# Altium integrated library LEMO Unipole And Multipole Type Connectors.IntLib: 1566 symbols (part 9 of 13)
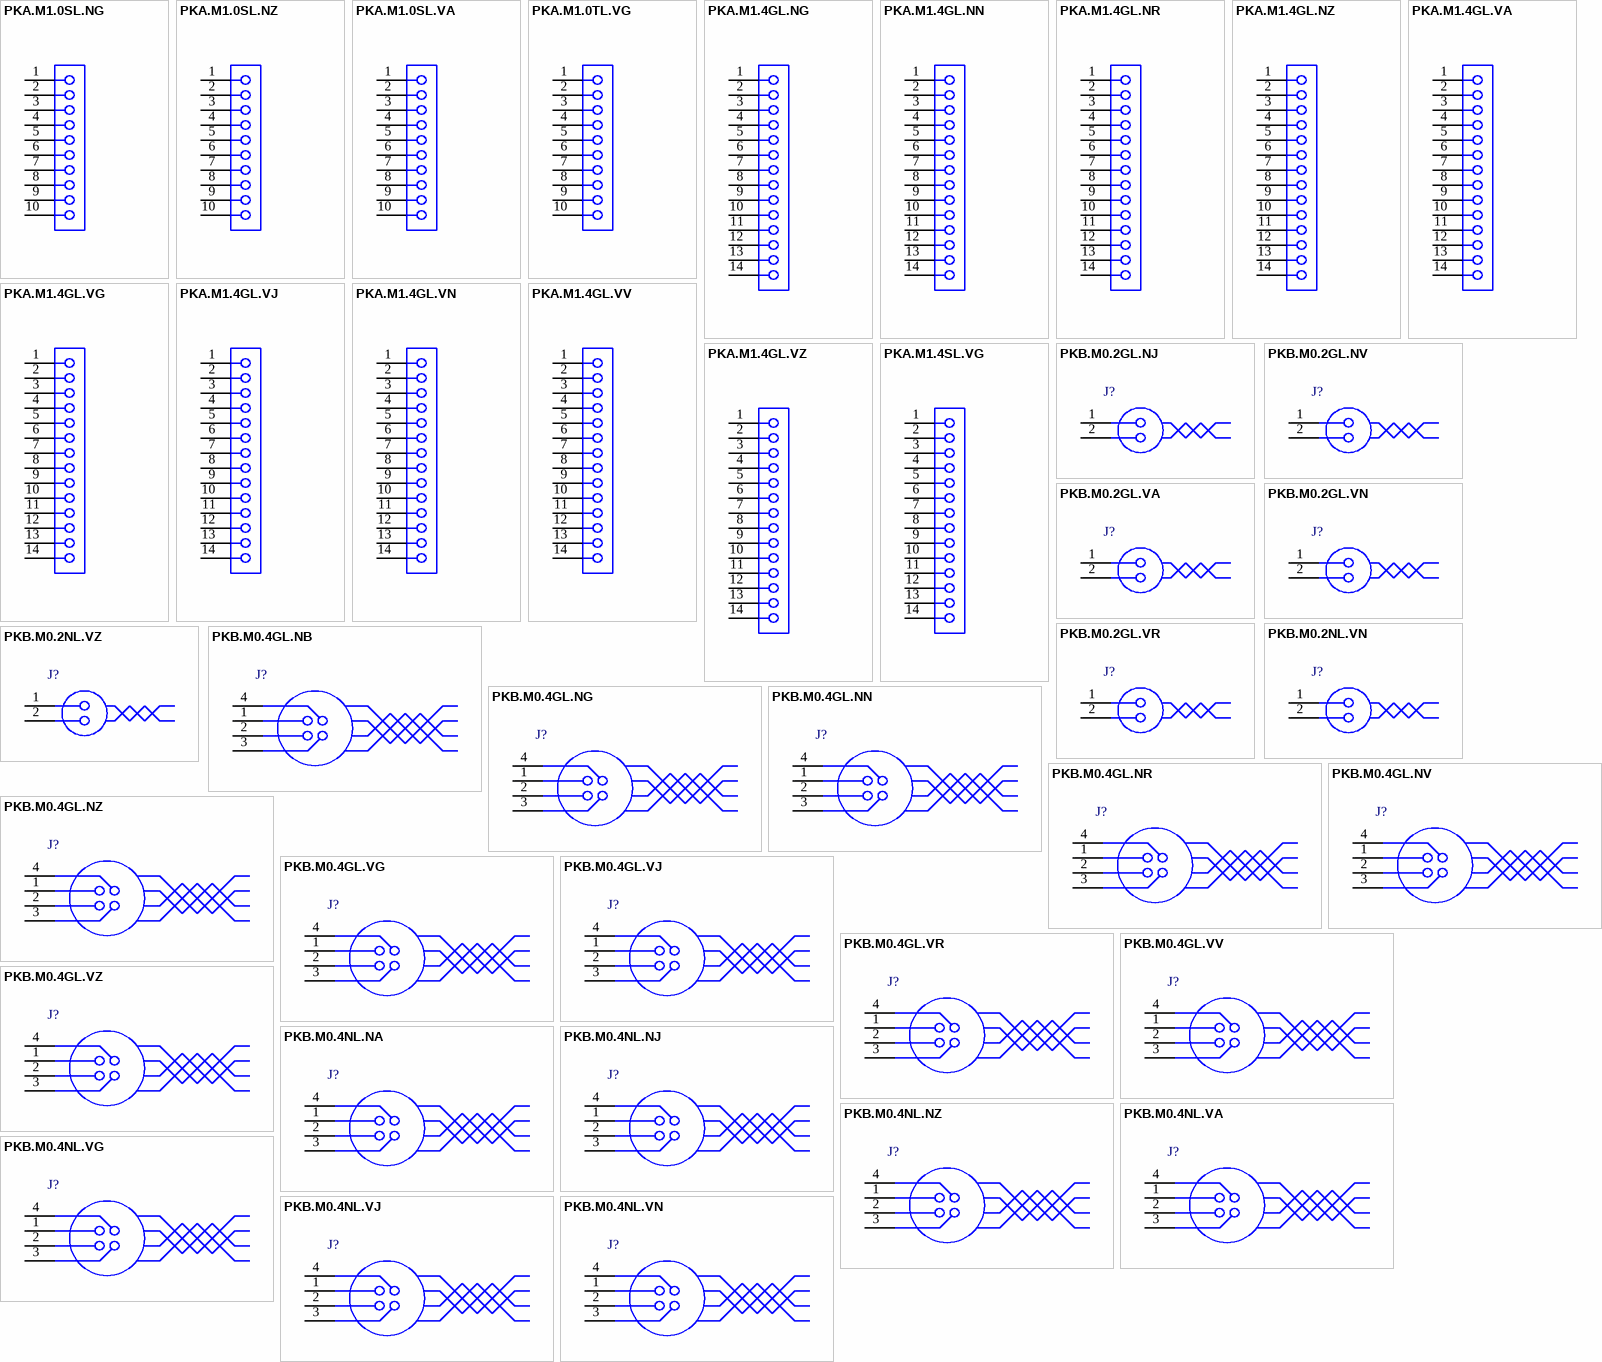
[diagram p51: symbols PKA.M1.0SL.NG to PKB.M0.4NL.VN]

## PKB.M0.4GL.NZ
designator J?
Fixed receptacle with 1 nut (without 2nd front nut), Key (B), P series, Multipole Type with 4 Contacts; Manufacturer: LEMO; PartNumber: PKB.M0.4GL.NZ; Number of contacts: 4; Contact Diameter: 0.9 mm; Test voltage (kV rms) Contact-Contact: 1.2; Rated Current(A): 8; DatasheetVersion: Jun-14; PackageReference: PKB.M0.4GL.NZ; PackageDescription: Fixed receptacle with 1 nut (without 2nd front nut), Key(B) for Printed Circuit; ComponentLink1Description: Manufacturer URL; ComponentLink1URL: http://www.lemo.com; ComponentLink2Description: Datasheet; ComponentLink2URL: http://intra.lemo.ch/catalog/ROW/UK_English/P_series_catalog.pdf
footprint PKB.M0.4GL.NZ (Socket, Female, Height 25 mm, Through hole)
pins: 1, 2, 3, 4

## PKB.M0.4GL.VG
designator J?
Fixed receptacle with two nuts (back panel mounting), 90° print contacts, Key (B), P series, Multipole Type with 4 Contacts; Manufacturer: LEMO; PartNumber: PKB.M0.4GL.VG; Number of contacts: 4; Contact Diameter: 0.9 mm; Test voltage (kV rms) Contact-Contact: 1.2; Rated Current(A): 8; DatasheetVersion: Jun-14; PackageReference: PKB.M0.4GL.VG; PackageDescription: Fixed receptacle with two nuts (back panel mounting), 90° print contacts, Key(B) for Printed Circuit; ComponentLink1Description: Manufacturer URL; ComponentLink1URL: http://www.lemo.com; ComponentLink2Description: Datasheet; ComponentLink2URL: http://intra.lemo.ch/catalog/ROW/UK_English/P_series_catalog.pdf
footprint PKB.M0.4GL.VG (Socket, Female, Height 33.5 mm, Through hole)
pins: 1, 2, 3, 4

## PKB.M0.4GL.VJ
designator J?
Fixed receptacle with two nuts (back panel mounting), 90° print contacts, Key (B), P series, Multipole Type with 4 Contacts; Manufacturer: LEMO; PartNumber: PKB.M0.4GL.VJ; Number of contacts: 4; Contact Diameter: 0.9 mm; Test voltage (kV rms) Contact-Contact: 1.2; Rated Current(A): 8; DatasheetVersion: Jun-14; PackageReference: PKB.M0.4GL.VJ; PackageDescription: Fixed receptacle with two nuts (back panel mounting), 90° print contacts, Key(B) for Printed Circuit; ComponentLink1Description: Manufacturer URL; ComponentLink1URL: http://www.lemo.com; ComponentLink2Description: Datasheet; ComponentLink2URL: http://intra.lemo.ch/catalog/ROW/UK_English/P_series_catalog.pdf
footprint PKB.M0.4GL.VJ (Socket, Female, Height 33.5 mm, Through hole)
pins: 1, 2, 3, 4

## PKB.M0.4GL.VR
designator J?
Fixed receptacle with two nuts (back panel mounting), 90° print contacts, Key (B), P series, Multipole Type with 4 Contacts; Manufacturer: LEMO; PartNumber: PKB.M0.4GL.VR; Number of contacts: 4; Contact Diameter: 0.9 mm; Test voltage (kV rms) Contact-Contact: 1.2; Rated Current(A): 8; DatasheetVersion: Jun-14; PackageReference: PKB.M0.4GL.VR; PackageDescription: Fixed receptacle with two nuts (back panel mounting), 90° print contacts, Key(B) for Printed Circuit; ComponentLink1Description: Manufacturer URL; ComponentLink1URL: http://www.lemo.com; ComponentLink2Description: Datasheet; ComponentLink2URL: http://intra.lemo.ch/catalog/ROW/UK_English/P_series_catalog.pdf
footprint PKB.M0.4GL.VR (Socket, Female, Height 33.5 mm, Through hole)
pins: 1, 2, 3, 4

## PKB.M0.4GL.VV
designator J?
Fixed receptacle with two nuts (back panel mounting), 90° print contacts, Key (B), P series, Multipole Type with 4 Contacts; Manufacturer: LEMO; PartNumber: PKB.M0.4GL.VV; Number of contacts: 4; Contact Diameter: 0.9 mm; Test voltage (kV rms) Contact-Contact: 1.2; Rated Current(A): 8; DatasheetVersion: Jun-14; PackageReference: PKB.M0.4GL.VV; PackageDescription: Fixed receptacle with two nuts (back panel mounting), 90° print contacts, Key(B) for Printed Circuit; ComponentLink1Description: Manufacturer URL; ComponentLink1URL: http://www.lemo.com; ComponentLink2Description: Datasheet; ComponentLink2URL: http://intra.lemo.ch/catalog/ROW/UK_English/P_series_catalog.pdf
footprint PKB.M0.4GL.VV (Socket, Female, Height 33.5 mm, Through hole)
pins: 1, 2, 3, 4

## PKB.M0.4GL.VZ
designator J?
Fixed receptacle with 1 nut (without 2nd front nut), Key (B), P series, Multipole Type with 4 Contacts; Manufacturer: LEMO; PartNumber: PKB.M0.4GL.VZ; Number of contacts: 4; Contact Diameter: 0.9 mm; Test voltage (kV rms) Contact-Contact: 1.2; Rated Current(A): 8; DatasheetVersion: Jun-14; PackageReference: PKB.M0.4GL.VZ; PackageDescription: Fixed receptacle with 1 nut (without 2nd front nut), Key(B) for Printed Circuit; ComponentLink1Description: Manufacturer URL; ComponentLink1URL: http://www.lemo.com; ComponentLink2Description: Datasheet; ComponentLink2URL: http://intra.lemo.ch/catalog/ROW/UK_English/P_series_catalog.pdf
footprint PKB.M0.4GL.VZ (Socket, Female, Height 33.5 mm, Through hole)
pins: 1, 2, 3, 4

## PKB.M0.4NL.NA
designator J?
Fixed receptacle with two nuts (back panel mounting), straight print contacts, Key (B),  series, Multipole Type with 4 Contacts; Manufacturer: LEMO; PartNumber: PKB.M0.4NL.NA; Number of contacts: 4; Contact Diameter: 0.9 mm; Test voltage (kV rms) Contact-Contact: 1.2; Rated Current(A): 8; DatasheetVersion: Jun-14; PackageReference: PKB.M0.4NL.NA; PackageDescription: Fixed receptacle with two nuts (back panel mounting), straight print contacts, Key(B) for Printed Circuit; ComponentLink1Description: Manufacturer URL; ComponentLink1URL: http://www.lemo.com; ComponentLink2Description: Datasheet; ComponentLink2URL: http://intra.lemo.ch/catalog/ROW/UK_English/P_series_catalog.pdf
footprint PKB.M0.4NL.NA (Socket, Female, Height 33.5 mm, Through hole)
pins: 1, 2, 3, 4

## PKB.M0.4NL.NJ
designator J?
Fixed receptacle with two nuts (back panel mounting), straight print contacts, Key (B), P series, Multipole Type with 4 Contacts; Manufacturer: LEMO; PartNumber: PKB.M0.4NL.NJ; Number of contacts: 4; Contact Diameter: 0.9 mm; Test voltage (kV rms) Contact-Contact: 1.2; Rated Current(A): 8; DatasheetVersion: Jun-14; PackageReference: PKB.M0.4NL.NJ; PackageDescription: Fixed receptacle with two nuts (back panel mounting), straight print contacts, Key(B) for Printed Circuit; ComponentLink1Description: Manufacturer URL; ComponentLink1URL: http://www.lemo.com; ComponentLink2Description: Datasheet; ComponentLink2URL: http://intra.lemo.ch/catalog/ROW/UK_English/P_series_catalog.pdf
footprint PKB.M0.4NL.NJ (Socket, Female, Height 33.5 mm, Through hole)
pins: 1, 2, 3, 4

## PKB.M0.4NL.NZ
designator J?
Fixed receptacle with 1 nut (without 2nd front nut), Key (B), P series, Multipole Type with 4 Contacts; Manufacturer: LEMO; PartNumber: PKB.M0.4NL.NZ; Number of contacts: 4; Contact Diameter: 0.9 mm; Test voltage (kV rms) Contact-Contact: 1.2; Rated Current(A): 8; DatasheetVersion: Jun-14; PackageReference: PKB.M0.4NL.NZ; PackageDescription: Fixed receptacle with 1 nut (without 2nd front nut), Key(B) for Printed Circuit; ComponentLink1Description: Manufacturer URL; ComponentLink1URL: http://www.lemo.com; ComponentLink2Description: Datasheet; ComponentLink2URL: http://intra.lemo.ch/catalog/ROW/UK_English/P_series_catalog.pdf
footprint PKB.M0.4NL.NZ (Socket, Female, Height 25 mm, Through hole)
pins: 1, 2, 3, 4

## PKB.M0.4NL.VA
designator J?
Fixed receptacle with two nuts (back panel mounting), 90° print contacts, Key (B),  series, Multipole Type with 4 Contacts; Manufacturer: LEMO; PartNumber: PKB.M0.4NL.VA; Number of contacts: 4; Contact Diameter: 0.9 mm; Test voltage (kV rms) Contact-Contact: 1.2; Rated Current(A): 8; DatasheetVersion: Jun-14; PackageReference: PKB.M0.4NL.VA; PackageDescription: Fixed receptacle with two nuts (back panel mounting), 90° print contacts, Key(B) for Printed Circuit; ComponentLink1Description: Manufacturer URL; ComponentLink1URL: http://www.lemo.com; ComponentLink2Description: Datasheet; ComponentLink2URL: http://intra.lemo.ch/catalog/ROW/UK_English/P_series_catalog.pdf
footprint PKB.M0.4NL.VA (Socket, Female, Height 33.5 mm, Through hole)
pins: 1, 2, 3, 4

## PKB.M0.4NL.VG
designator J?
Fixed receptacle with two nuts (back panel mounting), 90° print contacts, Key (B), P series, Multipole Type with 4 Contacts; Manufacturer: LEMO; PartNumber: PKB.M0.4NL.VG; Number of contacts: 4; Contact Diameter: 0.9 mm; Test voltage (kV rms) Contact-Contact: 1.2; Rated Current(A): 8; DatasheetVersion: Jun-14; PackageReference: PKB.M0.4NL.VG; PackageDescription: Fixed receptacle with two nuts (back panel mounting), 90° print contacts, Key(B) for Printed Circuit; ComponentLink1Description: Manufacturer URL; ComponentLink1URL: http://www.lemo.com; ComponentLink2Description: Datasheet; ComponentLink2URL: http://intra.lemo.ch/catalog/ROW/UK_English/P_series_catalog.pdf
footprint PKB.M0.4NL.VG (Socket, Female, Height 33.5 mm, Through hole)
pins: 1, 2, 3, 4

## PKB.M0.4NL.VJ
designator J?
Fixed receptacle with two nuts (back panel mounting), 90° print contacts, Key (B), P series, Multipole Type with 4 Contacts; Manufacturer: LEMO; PartNumber: PKB.M0.4NL.VJ; Number of contacts: 4; Contact Diameter: 0.9 mm; Test voltage (kV rms) Contact-Contact: 1.2; Rated Current(A): 8; DatasheetVersion: Jun-14; PackageReference: PKB.M0.4NL.VJ; PackageDescription: Fixed receptacle with two nuts (back panel mounting), 90° print contacts, Key(B) for Printed Circuit; ComponentLink1Description: Manufacturer URL; ComponentLink1URL: http://www.lemo.com; ComponentLink2Description: Datasheet; ComponentLink2URL: http://intra.lemo.ch/catalog/ROW/UK_English/P_series_catalog.pdf
footprint PKB.M0.4NL.VJ (Socket, Female, Height 33.5 mm, Through hole)
pins: 1, 2, 3, 4

## PKB.M0.4NL.VN
designator J?
Fixed receptacle with two nuts (back panel mounting), 90° print contacts, Key (B), P series, Multipole Type with 4 Contacts; Manufacturer: LEMO; PartNumber: PKB.M0.4NL.VN; Number of contacts: 4; Contact Diameter: 0.9 mm; Test voltage (kV rms) Contact-Contact: 1.2; Rated Current(A): 8; DatasheetVersion: Jun-14; PackageReference: PKB.M0.4NL.VN; PackageDescription: Fixed receptacle with two nuts (back panel mounting), 90° print contacts, Key(B) for Printed Circuit; ComponentLink1Description: Manufacturer URL; ComponentLink1URL: http://www.lemo.com; ComponentLink2Description: Datasheet; ComponentLink2URL: http://intra.lemo.ch/catalog/ROW/UK_English/P_series_catalog.pdf
footprint PKB.M0.4NL.VN (Socket, Female, Height 33.5 mm, Through hole)
pins: 1, 2, 3, 4

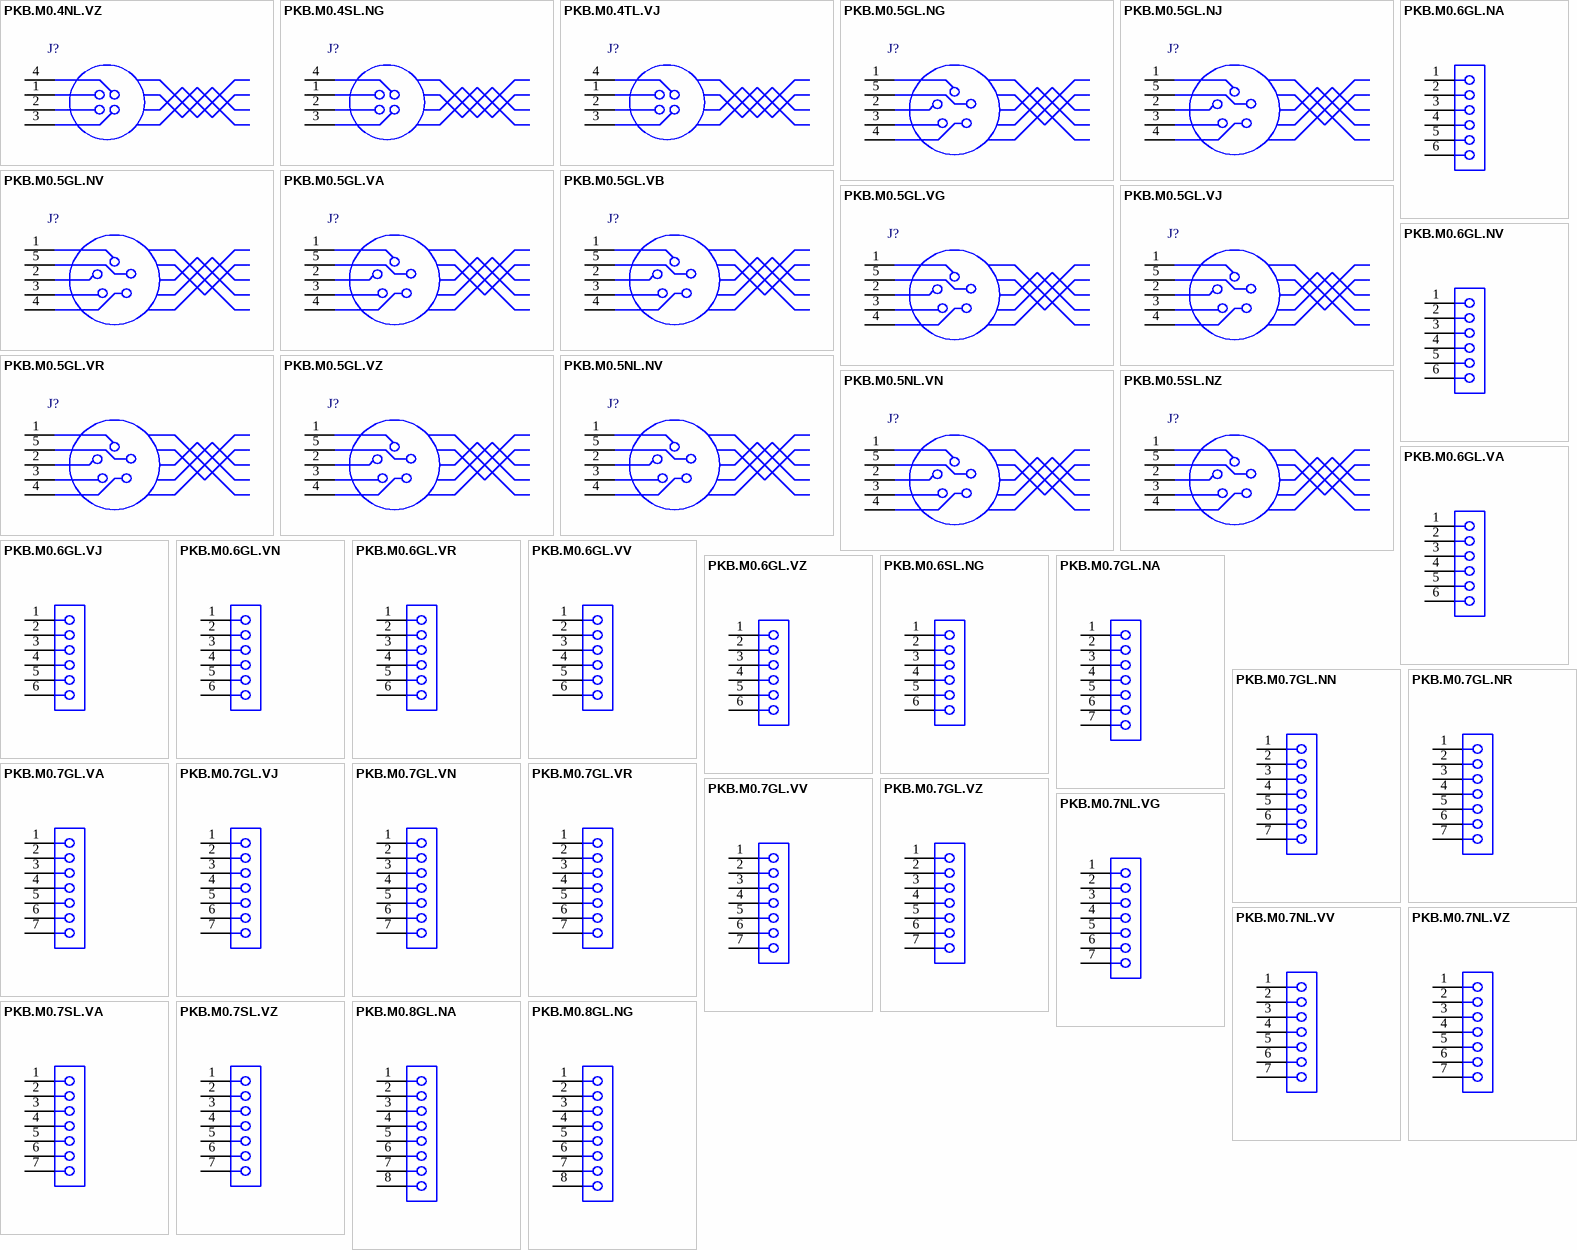
[diagram p28: symbols PKB.M0.4NL.VZ to PKB.M0.8GL.NG]

## PKB.M0.4NL.VZ
designator J?
Fixed receptacle with 1 nut (without 2nd front nut), Key (B), P series, Multipole Type with 4 Contacts; Manufacturer: LEMO; PartNumber: PKB.M0.4NL.VZ; Number of contacts: 4; Contact Diameter: 0.9 mm; Test voltage (kV rms) Contact-Contact: 1.2; Rated Current(A): 8; DatasheetVersion: Jun-14; PackageReference: PKB.M0.4NL.VZ; PackageDescription: Fixed receptacle with 1 nut (without 2nd front nut), Key(B) for Printed Circuit; ComponentLink1Description: Manufacturer URL; ComponentLink1URL: http://www.lemo.com; ComponentLink2Description: Datasheet; ComponentLink2URL: http://intra.lemo.ch/catalog/ROW/UK_English/P_series_catalog.pdf
footprint PKB.M0.4NL.VZ (Socket, Female, Height 33.5 mm, Through hole)
pins: 1, 2, 3, 4

## PKB.M0.4SL.NG
designator J?
Fixed receptacle with two nuts (back panel mounting), straight print contacts, Key (B), P series, Multipole Type with 4 Contacts; Manufacturer: LEMO; PartNumber: PKB.M0.4SL.NG; Number of contacts: 4; Contact Diameter: 0.9 mm; Test voltage (kV rms) Contact-Contact: 1.2; Rated Current(A): 8; DatasheetVersion: Jun-14; PackageReference: PKB.M0.4SL.NG; PackageDescription: Fixed receptacle with two nuts (back panel mounting), straight print contacts, Key(B) for Printed Circuit; ComponentLink1Description: Manufacturer URL; ComponentLink1URL: http://www.lemo.com; ComponentLink2Description: Datasheet; ComponentLink2URL: http://intra.lemo.ch/catalog/ROW/UK_English/P_series_catalog.pdf
footprint PKB.M0.4SL.NG (Socket, Female, Height 33.5 mm, Through hole)
pins: 1, 2, 3, 4

## PKB.M0.4TL.VJ
designator J?
Fixed receptacle with two nuts (back panel mounting), 90° print contacts, Key (B), P series, Multipole Type with 4 Contacts; Manufacturer: LEMO; PartNumber: PKB.M0.4TL.VJ; Number of contacts: 4; Contact Diameter: 0.9 mm; Test voltage (kV rms) Contact-Contact: 1.2; Rated Current(A): 8; DatasheetVersion: Jun-14; PackageReference: PKB.M0.4TL.VJ; PackageDescription: Fixed receptacle with two nuts (back panel mounting), 90° print contacts, Key(B) for Printed Circuit; ComponentLink1Description: Manufacturer URL; ComponentLink1URL: http://www.lemo.com; ComponentLink2Description: Datasheet; ComponentLink2URL: http://intra.lemo.ch/catalog/ROW/UK_English/P_series_catalog.pdf
footprint PKB.M0.4TL.VJ (Socket, Female, Height 33.5 mm, Through hole)
pins: 1, 2, 3, 4

## PKB.M0.5GL.NG
designator J?
Fixed receptacle with two nuts (back panel mounting), straight print contacts, Key (B), P series, Multipole Type with 5 Contacts; Manufacturer: LEMO; PartNumber: PKB.M0.5GL.NG; Number of contacts: 5; Contact Diameter: 0.9 mm; Test voltage (kV rms) Contact-Contact: 1.05; Rated Current(A): 7; DatasheetVersion: Jun-14; PackageReference: PKB.M0.5GL.NG; PackageDescription: Fixed receptacle with two nuts (back panel mounting), straight print contacts, Key(B) for Printed Circuit; ComponentLink1Description: Manufacturer URL; ComponentLink1URL: http://www.lemo.com; ComponentLink2Description: Datasheet; ComponentLink2URL: http://intra.lemo.ch/catalog/ROW/UK_English/P_series_catalog.pdf
footprint PKB.M0.5GL.NG (Socket, Female, Height 33.5 mm, Through hole)
pins: 1, 2, 3, 4, 5

## PKB.M0.5GL.NJ
designator J?
Fixed receptacle with two nuts (back panel mounting), straight print contacts, Key (B), P series, Multipole Type with 5 Contacts; Manufacturer: LEMO; PartNumber: PKB.M0.5GL.NJ; Number of contacts: 5; Contact Diameter: 0.9 mm; Test voltage (kV rms) Contact-Contact: 1.05; Rated Current(A): 7; DatasheetVersion: Jun-14; PackageReference: PKB.M0.5GL.NJ; PackageDescription: Fixed receptacle with two nuts (back panel mounting), straight print contacts, Key(B) for Printed Circuit; ComponentLink1Description: Manufacturer URL; ComponentLink1URL: http://www.lemo.com; ComponentLink2Description: Datasheet; ComponentLink2URL: http://intra.lemo.ch/catalog/ROW/UK_English/P_series_catalog.pdf
footprint PKB.M0.5GL.NJ (Socket, Female, Height 33.5 mm, Through hole)
pins: 1, 2, 3, 4, 5

## PKB.M0.5GL.NV
designator J?
Fixed receptacle with two nuts (back panel mounting), straight print contacts, Key (B), P series, Multipole Type with 5 Contacts; Manufacturer: LEMO; PartNumber: PKB.M0.5GL.NV; Number of contacts: 5; Contact Diameter: 0.9 mm; Test voltage (kV rms) Contact-Contact: 1.05; Rated Current(A): 7; DatasheetVersion: Jun-14; PackageReference: PKB.M0.5GL.NV; PackageDescription: Fixed receptacle with two nuts (back panel mounting), straight print contacts, Key(B) for Printed Circuit; ComponentLink1Description: Manufacturer URL; ComponentLink1URL: http://www.lemo.com; ComponentLink2Description: Datasheet; ComponentLink2URL: http://intra.lemo.ch/catalog/ROW/UK_English/P_series_catalog.pdf
footprint PKB.M0.5GL.NV (Socket, Female, Height 33.5 mm, Through hole)
pins: 1, 2, 3, 4, 5

## PKB.M0.5GL.VA
designator J?
Fixed receptacle with two nuts (back panel mounting), 90° print contacts, Key (B),  series, Multipole Type with 5 Contacts; Manufacturer: LEMO; PartNumber: PKB.M0.5GL.VA; Number of contacts: 5; Contact Diameter: 0.9 mm; Test voltage (kV rms) Contact-Contact: 1.05; Rated Current(A): 7; DatasheetVersion: Jun-14; PackageReference: PKB.M0.5GL.VA; PackageDescription: Fixed receptacle with two nuts (back panel mounting), 90° print contacts, Key(B) for Printed Circuit; ComponentLink1Description: Manufacturer URL; ComponentLink1URL: http://www.lemo.com; ComponentLink2Description: Datasheet; ComponentLink2URL: http://intra.lemo.ch/catalog/ROW/UK_English/P_series_catalog.pdf
footprint PKB.M0.5GL.VA (Socket, Female, Height 33.5 mm, Through hole)
pins: 1, 2, 3, 4, 5

## PKB.M0.5GL.VB
designator J?
Fixed receptacle with two nuts (back panel mounting), 90° print contacts, Key (B), P series, Multipole Type with 5 Contacts; Manufacturer: LEMO; PartNumber: PKB.M0.5GL.VB; Number of contacts: 5; Contact Diameter: 0.9 mm; Test voltage (kV rms) Contact-Contact: 1.05; Rated Current(A): 7; DatasheetVersion: Jun-14; PackageReference: PKB.M0.5GL.VB; PackageDescription: Fixed receptacle with two nuts (back panel mounting), 90° print contacts, Key(B) for Printed Circuit; ComponentLink1Description: Manufacturer URL; ComponentLink1URL: http://www.lemo.com; ComponentLink2Description: Datasheet; ComponentLink2URL: http://intra.lemo.ch/catalog/ROW/UK_English/P_series_catalog.pdf
footprint PKB.M0.5GL.VB (Socket, Female, Through hole)
pins: 1, 2, 3, 4, 5

## PKB.M0.5GL.VG
designator J?
Fixed receptacle with two nuts (back panel mounting), 90° print contacts, Key (B), P series, Multipole Type with 5 Contacts; Manufacturer: LEMO; PartNumber: PKB.M0.5GL.VG; Number of contacts: 5; Contact Diameter: 0.9 mm; Test voltage (kV rms) Contact-Contact: 1.05; Rated Current(A): 7; DatasheetVersion: Jun-14; PackageReference: PKB.M0.5GL.VG; PackageDescription: Fixed receptacle with two nuts (back panel mounting), 90° print contacts, Key(B) for Printed Circuit; ComponentLink1Description: Manufacturer URL; ComponentLink1URL: http://www.lemo.com; ComponentLink2Description: Datasheet; ComponentLink2URL: http://intra.lemo.ch/catalog/ROW/UK_English/P_series_catalog.pdf
footprint PKB.M0.5GL.VG (Socket, Female, Height 33.5 mm, Through hole)
pins: 1, 2, 3, 4, 5

## PKB.M0.5GL.VJ
designator J?
Fixed receptacle with two nuts (back panel mounting), 90° print contacts, Key (B), P series, Multipole Type with 5 Contacts; Manufacturer: LEMO; PartNumber: PKB.M0.5GL.VJ; Number of contacts: 5; Contact Diameter: 0.9 mm; Test voltage (kV rms) Contact-Contact: 1.05; Rated Current(A): 7; DatasheetVersion: Jun-14; PackageReference: PKB.M0.5GL.VJ; PackageDescription: Fixed receptacle with two nuts (back panel mounting), 90° print contacts, Key(B) for Printed Circuit; ComponentLink1Description: Manufacturer URL; ComponentLink1URL: http://www.lemo.com; ComponentLink2Description: Datasheet; ComponentLink2URL: http://intra.lemo.ch/catalog/ROW/UK_English/P_series_catalog.pdf
footprint PKB.M0.5GL.VJ (Socket, Female, Height 33.5 mm, Through hole)
pins: 1, 2, 3, 4, 5

## PKB.M0.5GL.VR
designator J?
Fixed receptacle with two nuts (back panel mounting), 90° print contacts, Key (B), P series, Multipole Type with 5 Contacts; Manufacturer: LEMO; PartNumber: PKB.M0.5GL.VR; Number of contacts: 5; Contact Diameter: 0.9 mm; Test voltage (kV rms) Contact-Contact: 1.05; Rated Current(A): 7; DatasheetVersion: Jun-14; PackageReference: PKB.M0.5GL.VR; PackageDescription: Fixed receptacle with two nuts (back panel mounting), 90° print contacts, Key(B) for Printed Circuit; ComponentLink1Description: Manufacturer URL; ComponentLink1URL: http://www.lemo.com; ComponentLink2Description: Datasheet; ComponentLink2URL: http://intra.lemo.ch/catalog/ROW/UK_English/P_series_catalog.pdf
footprint PKB.M0.5GL.VR (Socket, Female, Height 33.5 mm, Through hole)
pins: 1, 2, 3, 4, 5

## PKB.M0.5GL.VZ
designator J?
Fixed receptacle with 1 nut (without 2nd front nut), Key (B), P series, Multipole Type with 5 Contacts; Manufacturer: LEMO; PartNumber: PKB.M0.5GL.VZ; Number of contacts: 5; Contact Diameter: 0.9 mm; Test voltage (kV rms) Contact-Contact: 1.05; Rated Current(A): 7; DatasheetVersion: Jun-14; PackageReference: PKB.M0.5GL.VZ; PackageDescription: Fixed receptacle with 1 nut (without 2nd front nut), Key(B) for Printed Circuit; ComponentLink1Description: Manufacturer URL; ComponentLink1URL: http://www.lemo.com; ComponentLink2Description: Datasheet; ComponentLink2URL: http://intra.lemo.ch/catalog/ROW/UK_English/P_series_catalog.pdf
footprint PKB.M0.5GL.VZ (Socket, Female, Height 33.5 mm, Through hole)
pins: 1, 2, 3, 4, 5

## PKB.M0.5NL.NV
designator J?
Fixed receptacle with two nuts (back panel mounting), straight print contacts, Key (B), P series, Multipole Type with 5 Contacts; Manufacturer: LEMO; PartNumber: PKB.M0.5NL.NV; Number of contacts: 5; Contact Diameter: 0.9 mm; Test voltage (kV rms) Contact-Contact: 1.05; Rated Current(A): 7; DatasheetVersion: Jun-14; PackageReference: PKB.M0.5NL.NV; PackageDescription: Fixed receptacle with two nuts (back panel mounting), straight print contacts, Key(B) for Printed Circuit; ComponentLink1Description: Manufacturer URL; ComponentLink1URL: http://www.lemo.com; ComponentLink2Description: Datasheet; ComponentLink2URL: http://intra.lemo.ch/catalog/ROW/UK_English/P_series_catalog.pdf
footprint PKB.M0.5NL.NV (Socket, Female, Height 33.5 mm, Through hole)
pins: 1, 2, 3, 4, 5

## PKB.M0.5NL.VN
designator J?
Fixed receptacle with two nuts (back panel mounting), 90° print contacts, Key (B), P series, Multipole Type with 5 Contacts; Manufacturer: LEMO; PartNumber: PKB.M0.5NL.VN; Number of contacts: 5; Contact Diameter: 0.9 mm; Test voltage (kV rms) Contact-Contact: 1.05; Rated Current(A): 7; DatasheetVersion: Jun-14; PackageReference: PKB.M0.5NL.VN; PackageDescription: Fixed receptacle with two nuts (back panel mounting), 90° print contacts, Key(B) for Printed Circuit; ComponentLink1Description: Manufacturer URL; ComponentLink1URL: http://www.lemo.com; ComponentLink2Description: Datasheet; ComponentLink2URL: http://intra.lemo.ch/catalog/ROW/UK_English/P_series_catalog.pdf
footprint PKB.M0.5NL.VN (Socket, Female, Height 33.5 mm, Through hole)
pins: 1, 2, 3, 4, 5

## PKB.M0.5SL.NZ
designator J?
Fixed receptacle with 1 nut (without 2nd front nut), Key (B), P series, Multipole Type with 5 Contacts; Manufacturer: LEMO; PartNumber: PKB.M0.5SL.NZ; Number of contacts: 5; Contact Diameter: 0.9 mm; Test voltage (kV rms) Contact-Contact: 1.05; Rated Current(A): 7; DatasheetVersion: Jun-14; PackageReference: PKB.M0.5SL.NZ; PackageDescription: Fixed receptacle with 1 nut (without 2nd front nut), Key(B) for Printed Circuit; Supplier 1: Mouser; Supplier Part Number 1: 736-PKBM05SLNZ; Supplier 2: Digi-Key; Supplier Part Number 2: PKB.M0.5SL.NZ-ND; ComponentLink1Description: Manufacturer URL; ComponentLink1URL: http://www.lemo.com; ComponentLink2Description: Datasheet; ComponentLink2URL: http://intra.lemo.ch/catalog/ROW/UK_English/P_series_catalog.pdf
footprint PKB.M0.5SL.NZ (Socket, Female, Height 25 mm, Through hole)
pins: 1, 2, 3, 4, 5

## PKB.M0.6GL.NA
designator J?
Fixed receptacle with two nuts (back panel mounting), straight print contacts, Key (B), P series, Multipole Type with 6 Contacts; Manufacturer: LEMO; PartNumber: PKB.M0.6GL.NA; Number of contacts: 6; Contact Diameter: 0.7 mm; Test voltage (kV rms) Contact-Contact: 1.05; DatasheetVersion: Jun-14; PackageReference: PKB.M0.6GL.NA; PackageDescription: Fixed receptacle with two nuts (back panel mounting), straight print contacts, Key(B) for Printed Circuit; Rated Current(A): 6; ComponentLink1Description: Manufacturer URL; ComponentLink1URL: http://www.lemo.com; ComponentLink2Description: Datasheet; ComponentLink2URL: http://intra.lemo.ch/catalog/ROW/UK_English/P_series_catalog.pdf
footprint PKB.M0.6GL.NA (Socket, Female, Height 33.5 mm, Through hole)
pins: 1, 2, 3, 4, 5, 6

## PKB.M0.6GL.NV
designator J?
Fixed receptacle with two nuts (back panel mounting), straight print contacts, Key (B), P series, Multipole Type with 6 Contacts; Manufacturer: LEMO; PartNumber: PKB.M0.6GL.NV; Number of contacts: 6; Contact Diameter: 0.7 mm; Test voltage (kV rms) Contact-Contact: 1.05; DatasheetVersion: Jun-14; PackageReference: PKB.M0.6GL.NV; PackageDescription: Fixed receptacle with two nuts (back panel mounting), straight print contacts, Key(B) for Printed Circuit; Rated Current(A): 6; ComponentLink1Description: Manufacturer URL; ComponentLink1URL: http://www.lemo.com; ComponentLink2Description: Datasheet; ComponentLink2URL: http://intra.lemo.ch/catalog/ROW/UK_English/P_series_catalog.pdf
footprint PKB.M0.6GL.NV (Socket, Female, Height 33.5 mm, Through hole)
pins: 1, 2, 3, 4, 5, 6

## PKB.M0.6GL.VA
designator J?
Fixed receptacle with two nuts (back panel mounting), 90° print contacts, Key (B), P series, Multipole Type with 6 Contacts; Manufacturer: LEMO; PartNumber: PKB.M0.6GL.VA; Number of contacts: 6; Contact Diameter: 0.7 mm; Test voltage (kV rms) Contact-Contact: 1.05; DatasheetVersion: Jun-14; PackageReference: PKB.M0.6GL.VA; PackageDescription: Fixed receptacle with two nuts (back panel mounting), 90° print contacts, Key(B) for Printed Circuit; Rated Current(A): 6; ComponentLink1Description: Manufacturer URL; ComponentLink1URL: http://www.lemo.com; ComponentLink2Description: Datasheet; ComponentLink2URL: http://intra.lemo.ch/catalog/ROW/UK_English/P_series_catalog.pdf
footprint PKB.M0.6GL.VA (Socket, Female, Height 33.5 mm, Through hole)
pins: 1, 2, 3, 4, 5, 6

## PKB.M0.6GL.VJ
designator J?
Fixed receptacle with two nuts (back panel mounting), 90° print contacts, Key (B), P series, Multipole Type with 6 Contacts; Manufacturer: LEMO; PartNumber: PKB.M0.6GL.VJ; Number of contacts: 6; Contact Diameter: 0.7 mm; Test voltage (kV rms) Contact-Contact: 1.05; DatasheetVersion: Jun-14; PackageReference: PKB.M0.6GL.VJ; PackageDescription: Fixed receptacle with two nuts (back panel mounting), 90° print contacts, Key(B) for Printed Circuit; Rated Current(A): 6; ComponentLink1Description: Manufacturer URL; ComponentLink1URL: http://www.lemo.com; ComponentLink2Description: Datasheet; ComponentLink2URL: http://intra.lemo.ch/catalog/ROW/UK_English/P_series_catalog.pdf
footprint PKB.M0.6GL.VJ (Socket, Female, Height 33.5 mm, Through hole)
pins: 1, 2, 3, 4, 5, 6

## PKB.M0.6GL.VN
designator J?
Fixed receptacle with two nuts (back panel mounting), 90° print contacts, Key (B), P series, Multipole Type with 6 Contacts; Manufacturer: LEMO; PartNumber: PKB.M0.6GL.VN; Number of contacts: 6; Contact Diameter: 0.7 mm; Test voltage (kV rms) Contact-Contact: 1.05; DatasheetVersion: Jun-14; PackageReference: PKB.M0.6GL.VN; PackageDescription: Fixed receptacle with two nuts (back panel mounting), 90° print contacts, Key(B) for Printed Circuit; Rated Current(A): 6; ComponentLink1Description: Manufacturer URL; ComponentLink1URL: http://www.lemo.com; ComponentLink2Description: Datasheet; ComponentLink2URL: http://intra.lemo.ch/catalog/ROW/UK_English/P_series_catalog.pdf
footprint PKB.M0.6GL.VN (Socket, Female, Height 33.5 mm, Through hole)
pins: 1, 2, 3, 4, 5, 6

## PKB.M0.6GL.VR
designator J?
Fixed receptacle with two nuts (back panel mounting), 90° print contacts, Key (B), P series, Multipole Type with 6 Contacts; Manufacturer: LEMO; PartNumber: PKB.M0.6GL.VR; Number of contacts: 6; Contact Diameter: 0.7 mm; Test voltage (kV rms) Contact-Contact: 1.05; DatasheetVersion: Jun-14; PackageReference: PKB.M0.6GL.VR; PackageDescription: Fixed receptacle with two nuts (back panel mounting), 90° print contacts, Key(B) for Printed Circuit; Rated Current(A): 6; ComponentLink1Description: Manufacturer URL; ComponentLink1URL: http://www.lemo.com; ComponentLink2Description: Datasheet; ComponentLink2URL: http://intra.lemo.ch/catalog/ROW/UK_English/P_series_catalog.pdf
footprint PKB.M0.6GL.VR (Socket, Female, Height 33.5 mm, Through hole)
pins: 1, 2, 3, 4, 5, 6

## PKB.M0.6GL.VV
designator J?
Fixed receptacle with two nuts (back panel mounting), 90° print contacts, Key (B), P series, Multipole Type with 6 Contacts; Manufacturer: LEMO; PartNumber: PKB.M0.6GL.VV; Number of contacts: 6; Contact Diameter: 0.7 mm; Test voltage (kV rms) Contact-Contact: 1.05; DatasheetVersion: Jun-14; PackageReference: PKB.M0.6GL.VV; PackageDescription: Fixed receptacle with two nuts (back panel mounting), 90° print contacts, Key(B) for Printed Circuit; Rated Current(A): 6; ComponentLink1Description: Manufacturer URL; ComponentLink1URL: http://www.lemo.com; ComponentLink2Description: Datasheet; ComponentLink2URL: http://intra.lemo.ch/catalog/ROW/UK_English/P_series_catalog.pdf
footprint PKB.M0.6GL.VV (Socket, Female, Height 33.5 mm, Through hole)
pins: 1, 2, 3, 4, 5, 6

## PKB.M0.6GL.VZ
designator J?
Fixed receptacle with 1 nut (without 2nd front nut), Key (B), P series, Multipole Type with 6 Contacts; Manufacturer: LEMO; PartNumber: PKB.M0.6GL.VZ; Number of contacts: 6; Contact Diameter: 0.7 mm; Test voltage (kV rms) Contact-Contact: 1.05; DatasheetVersion: Jun-14; PackageReference: PKB.M0.6GL.VZ; PackageDescription: Fixed receptacle with 1 nut (without 2nd front nut), Key(B) for Printed Circuit; Rated Current(A): 6; ComponentLink1Description: Manufacturer URL; ComponentLink1URL: http://www.lemo.com; ComponentLink2Description: Datasheet; ComponentLink2URL: http://intra.lemo.ch/catalog/ROW/UK_English/P_series_catalog.pdf
footprint PKB.M0.6GL.VZ (Socket, Female, Height 33.5 mm, Through hole)
pins: 1, 2, 3, 4, 5, 6

## PKB.M0.6SL.NG
designator J?
Fixed receptacle with two nuts (back panel mounting), straight print contacts, Key (B), P series, Multipole Type with 6 Contacts; Manufacturer: LEMO; PartNumber: PKB.M0.6SL.NG; Number of contacts: 6; Contact Diameter: 0.7 mm; Test voltage (kV rms) Contact-Contact: 1.05; DatasheetVersion: Jun-14; PackageReference: PKB.M0.6SL.NG; PackageDescription: Fixed receptacle with two nuts (back panel mounting), straight print contacts, Key(B) for Printed Circuit; Supplier 1: Mouser; Supplier Part Number 1: 736-PKBM06SLNG; Supplier 2: Digi-Key; Supplier Part Number 2: PKB.M0.6SL.NG-ND; Rated Current(A): 6; ComponentLink1Description: Manufacturer URL; ComponentLink1URL: http://www.lemo.com; ComponentLink2Description: Datasheet; ComponentLink2URL: http://intra.lemo.ch/catalog/ROW/UK_English/P_series_catalog.pdf
footprint PKB.M0.6SL.NG (Socket, Female, Height 33.5 mm, Through hole)
pins: 1, 2, 3, 4, 5, 6

## PKB.M0.7GL.NA
designator J?
Fixed receptacle with two nuts (back panel mounting), straight print contacts, Key (B), P series, Multipole Type with 7 Contacts; Manufacturer: LEMO; PartNumber: PKB.M0.7GL.NA; Number of contacts: 7; Contact Diameter: 0.7 mm; Test voltage (kV rms) Contact-Contact: 1.05; Rated Current(A): 5; DatasheetVersion: Jun-14; PackageReference: PKB.M0.7GL.NA; PackageDescription: Fixed receptacle with two nuts (back panel mounting), straight print contacts, Key(B) for Printed Circuit; ComponentLink1Description: Manufacturer URL; ComponentLink1URL: http://www.lemo.com; ComponentLink2Description: Datasheet; ComponentLink2URL: http://intra.lemo.ch/catalog/ROW/UK_English/P_series_catalog.pdf
footprint PKB.M0.7GL.NA (Socket, Female, Height 33.5 mm, Through hole)
pins: 1, 2, 3, 4, 5, 6, 7

## PKB.M0.7GL.NN
designator J?
Fixed receptacle with two nuts (back panel mounting), straight print contacts, Key (B), P series, Multipole Type with 7 Contacts; Manufacturer: LEMO; PartNumber: PKB.M0.7GL.NN; Number of contacts: 7; Contact Diameter: 0.7 mm; Test voltage (kV rms) Contact-Contact: 1.05; Rated Current(A): 5; DatasheetVersion: Jun-14; PackageReference: PKB.M0.7GL.NN; PackageDescription: Fixed receptacle with two nuts (back panel mounting), straight print contacts, Key(B) for Printed Circuit; ComponentLink1Description: Manufacturer URL; ComponentLink1URL: http://www.lemo.com; ComponentLink2Description: Datasheet; ComponentLink2URL: http://intra.lemo.ch/catalog/ROW/UK_English/P_series_catalog.pdf
footprint PKB.M0.7GL.NN (Socket, Female, Height 33.5 mm, Through hole)
pins: 1, 2, 3, 4, 5, 6, 7

## PKB.M0.7GL.NR
designator J?
Fixed receptacle with two nuts (back panel mounting), straight print contacts, Key (B), P series, Multipole Type with 7 Contacts; Manufacturer: LEMO; PartNumber: PKB.M0.7GL.NR; Number of contacts: 7; Contact Diameter: 0.7 mm; Test voltage (kV rms) Contact-Contact: 1.05; Rated Current(A): 5; DatasheetVersion: Jun-14; PackageReference: PKB.M0.7GL.NR; PackageDescription: Fixed receptacle with two nuts (back panel mounting), straight print contacts, Key(B) for Printed Circuit; ComponentLink1Description: Manufacturer URL; ComponentLink1URL: http://www.lemo.com; ComponentLink2Description: Datasheet; ComponentLink2URL: http://intra.lemo.ch/catalog/ROW/UK_English/P_series_catalog.pdf
footprint PKB.M0.7GL.NR (Socket, Female, Height 33.5 mm, Through hole)
pins: 1, 2, 3, 4, 5, 6, 7

## PKB.M0.7GL.VA
designator J?
Fixed receptacle with two nuts (back panel mounting), 90° print contacts, Key (B), P series, Multipole Type with 7 Contacts; Manufacturer: LEMO; PartNumber: PKB.M0.7GL.VA; Number of contacts: 7; Contact Diameter: 0.7 mm; Test voltage (kV rms) Contact-Contact: 1.05; Rated Current(A): 5; DatasheetVersion: Jun-14; PackageReference: PKB.M0.7GL.VA; PackageDescription: Fixed receptacle with two nuts (back panel mounting), 90° print contacts, Key(B) for Printed Circuit; Supplier 1: Mouser; Supplier Part Number 1: 736-PKBM07GLVA; Supplier 2: Digi-Key; Supplier Part Number 2: PKB.M0.7GL.VA-ND; ComponentLink1Description: Manufacturer URL; ComponentLink1URL: http://www.lemo.com; ComponentLink2Description: Datasheet; ComponentLink2URL: http://intra.lemo.ch/catalog/ROW/UK_English/P_series_catalog.pdf
footprint PKB.M0.7GL.VA (Socket, Female, Height 33.5 mm, Through hole)
pins: 1, 2, 3, 4, 5, 6, 7

## PKB.M0.7GL.VJ
designator J?
Fixed receptacle with two nuts (back panel mounting), 90° print contacts, Key (B), P series, Multipole Type with 7 Contacts; Manufacturer: LEMO; PartNumber: PKB.M0.7GL.VJ; Number of contacts: 7; Contact Diameter: 0.7 mm; Test voltage (kV rms) Contact-Contact: 1.05; Rated Current(A): 5; DatasheetVersion: Jun-14; PackageReference: PKB.M0.7GL.VJ; PackageDescription: Fixed receptacle with two nuts (back panel mounting), 90° print contacts, Key(B) for Printed Circuit; ComponentLink1Description: Manufacturer URL; ComponentLink1URL: http://www.lemo.com; ComponentLink2Description: Datasheet; ComponentLink2URL: http://intra.lemo.ch/catalog/ROW/UK_English/P_series_catalog.pdf
footprint PKB.M0.7GL.VJ (Socket, Female, Height 33.5 mm, Through hole)
pins: 1, 2, 3, 4, 5, 6, 7

## PKB.M0.7GL.VN
designator J?
Fixed receptacle with two nuts (back panel mounting), 90° print contacts, Key (B), P series, Multipole Type with 7 Contacts; Manufacturer: LEMO; PartNumber: PKB.M0.7GL.VN; Number of contacts: 7; Contact Diameter: 0.7 mm; Test voltage (kV rms) Contact-Contact: 1.05; Rated Current(A): 5; DatasheetVersion: Jun-14; PackageReference: PKB.M0.7GL.VN; PackageDescription: Fixed receptacle with two nuts (back panel mounting), 90° print contacts, Key(B) for Printed Circuit; ComponentLink1Description: Manufacturer URL; ComponentLink1URL: http://www.lemo.com; ComponentLink2Description: Datasheet; ComponentLink2URL: http://intra.lemo.ch/catalog/ROW/UK_English/P_series_catalog.pdf
footprint PKB.M0.7GL.VN (Socket, Female, Height 33.5 mm, Through hole)
pins: 1, 2, 3, 4, 5, 6, 7

## PKB.M0.7GL.VR
designator J?
Fixed receptacle with two nuts (back panel mounting), 90° print contacts, Key (B), P series, Multipole Type with 7 Contacts; Manufacturer: LEMO; PartNumber: PKB.M0.7GL.VR; Number of contacts: 7; Contact Diameter: 0.7 mm; Test voltage (kV rms) Contact-Contact: 1.05; Rated Current(A): 5; DatasheetVersion: Jun-14; PackageReference: PKB.M0.7GL.VR; PackageDescription: Fixed receptacle with two nuts (back panel mounting), 90° print contacts, Key(B) for Printed Circuit; Supplier 1: Mouser; Supplier Part Number 1: 736-PKBM07GLVR; Supplier 2: Digi-Key; Supplier Part Number 2: PKB.M0.7GL.VR-ND; ComponentLink1Description: Manufacturer URL; ComponentLink1URL: http://www.lemo.com; ComponentLink2Description: Datasheet; ComponentLink2URL: http://intra.lemo.ch/catalog/ROW/UK_English/P_series_catalog.pdf
footprint PKB.M0.7GL.VR (Socket, Female, Height 33.5 mm, Through hole)
pins: 1, 2, 3, 4, 5, 6, 7

## PKB.M0.7GL.VV
designator J?
Fixed receptacle with two nuts (back panel mounting), 90° print contacts, Key (B), P series, Multipole Type with 7 Contacts; Manufacturer: LEMO; PartNumber: PKB.M0.7GL.VV; Number of contacts: 7; Contact Diameter: 0.7 mm; Test voltage (kV rms) Contact-Contact: 1.05; Rated Current(A): 5; DatasheetVersion: Jun-14; PackageReference: PKB.M0.7GL.VV; PackageDescription: Fixed receptacle with two nuts (back panel mounting), 90° print contacts, Key(B) for Printed Circuit; ComponentLink1Description: Manufacturer URL; ComponentLink1URL: http://www.lemo.com; ComponentLink2Description: Datasheet; ComponentLink2URL: http://intra.lemo.ch/catalog/ROW/UK_English/P_series_catalog.pdf
footprint PKB.M0.7GL.VV (Socket, Female, Height 33.5 mm, Through hole)
pins: 1, 2, 3, 4, 5, 6, 7

## PKB.M0.7GL.VZ
designator J?
Fixed receptacle with 1 nut (without 2nd front nut), Key (B), P series, Multipole Type with 7 Contacts; Manufacturer: LEMO; PartNumber: PKB.M0.7GL.VZ; Number of contacts: 7; Contact Diameter: 0.7 mm; Test voltage (kV rms) Contact-Contact: 1.05; Rated Current(A): 5; DatasheetVersion: Jun-14; PackageReference: PKB.M0.7GL.VZ; PackageDescription: Fixed receptacle with 1 nut (without 2nd front nut), Key(B) for Printed Circuit; Supplier 1: Mouser; Supplier Part Number 1: 736-PKBM07GLVZ; Supplier 2: Digi-Key; Supplier Part Number 2: PKB.M0.7GL.VZ-ND; ComponentLink1Description: Manufacturer URL; ComponentLink1URL: http://www.lemo.com; ComponentLink2Description: Datasheet; ComponentLink2URL: http://intra.lemo.ch/catalog/ROW/UK_English/P_series_catalog.pdf
footprint PKB.M0.7GL.VZ (Socket, Female, Height 33.5 mm, Through hole)
pins: 1, 2, 3, 4, 5, 6, 7

## PKB.M0.7NL.VG
designator J?
Fixed receptacle with two nuts (back panel mounting), 90° print contacts, Key (B), P series, Multipole Type with 7 Contacts; Manufacturer: LEMO; PartNumber: PKB.M0.7NL.VG; Number of contacts: 7; Contact Diameter: 0.7 mm; Test voltage (kV rms) Contact-Contact: 1.05; Rated Current(A): 5; DatasheetVersion: Jun-14; PackageReference: PKB.M0.7NL.VG; PackageDescription: Fixed receptacle with two nuts (back panel mounting), 90° print contacts, Key(B) for Printed Circuit; ComponentLink1Description: Manufacturer URL; ComponentLink1URL: http://www.lemo.com; ComponentLink2Description: Datasheet; ComponentLink2URL: http://intra.lemo.ch/catalog/ROW/UK_English/P_series_catalog.pdf
footprint PKB.M0.7NL.VG (Socket, Female, Height 33.5 mm, Through hole)
pins: 1, 2, 3, 4, 5, 6, 7

## PKB.M0.7NL.VV
designator J?
Fixed receptacle with two nuts (back panel mounting), 90° print contacts, Key (B),  series, Multipole Type with 7 Contacts; Manufacturer: LEMO; PartNumber: PKB.M0.7NL.VV; Number of contacts: 7; Contact Diameter: 0.7 mm; Test voltage (kV rms) Contact-Contact: 1.05; Rated Current(A): 5; DatasheetVersion: Jun-14; PackageReference: PKB.M0.7NL.VV; PackageDescription: Fixed receptacle with two nuts (back panel mounting), 90° print contacts, Key(B) for Printed Circuit; ComponentLink1Description: Manufacturer URL; ComponentLink1URL: http://www.lemo.com; ComponentLink2Description: Datasheet; ComponentLink2URL: http://intra.lemo.ch/catalog/ROW/UK_English/P_series_catalog.pdf
footprint PKB.M0.7NL.VV (Socket, Female, Height 33.5 mm, Through hole)
pins: 1, 2, 3, 4, 5, 6, 7

## PKB.M0.7NL.VZ
designator J?
Fixed receptacle with 1 nut (without 2nd front nut), Key (B), P series, Multipole Type with 7 Contacts; Manufacturer: LEMO; PartNumber: PKB.M0.7NL.VZ; Number of contacts: 7; Contact Diameter: 0.7 mm; Test voltage (kV rms) Contact-Contact: 1.05; Rated Current(A): 5; DatasheetVersion: Jun-14; PackageReference: PKB.M0.7NL.VZ; PackageDescription: Fixed receptacle with 1 nut (without 2nd front nut), Key(B) for Printed Circuit; ComponentLink1Description: Manufacturer URL; ComponentLink1URL: http://www.lemo.com; ComponentLink2Description: Datasheet; ComponentLink2URL: http://intra.lemo.ch/catalog/ROW/UK_English/P_series_catalog.pdf
footprint PKB.M0.7NL.VZ (Socket, Female, Height 33.5 mm, Through hole)
pins: 1, 2, 3, 4, 5, 6, 7

## PKB.M0.7SL.VA
designator J?
Fixed receptacle with two nuts (back panel mounting), 90° print contacts, Key (B),  series, Multipole Type with 7 Contacts; Manufacturer: LEMO; PartNumber: PKB.M0.7SL.VA; Number of contacts: 7; Contact Diameter: 0.7 mm; Test voltage (kV rms) Contact-Contact: 1.05; Rated Current(A): 5; DatasheetVersion: Jun-14; PackageReference: PKB.M0.7SL.VA; PackageDescription: Fixed receptacle with two nuts (back panel mounting), 90° print contacts, Key(B) for Printed Circuit; Supplier 1: Mouser; Supplier Part Number 1: 736-PKBM07SLVA; Supplier 2: Digi-Key; Supplier Part Number 2: PKB.M0.7SL.VA-ND; ComponentLink1Description: Manufacturer URL; ComponentLink1URL: http://www.lemo.com; ComponentLink2Description: Datasheet; ComponentLink2URL: http://intra.lemo.ch/catalog/ROW/UK_English/P_series_catalog.pdf
footprint PKB.M0.7SL.VA (Socket, Female, Height 33.5 mm, Through hole)
pins: 1, 2, 3, 4, 5, 6, 7

## PKB.M0.7SL.VZ
designator J?
Fixed receptacle with 1 nut (without 2nd front nut), Key (B), P series, Multipole Type with 7 Contacts; Manufacturer: LEMO; PartNumber: PKB.M0.7SL.VZ; Number of contacts: 7; Contact Diameter: 0.7 mm; Test voltage (kV rms) Contact-Contact: 1.05; Rated Current(A): 5; DatasheetVersion: Jun-14; PackageReference: PKB.M0.7SL.VZ; PackageDescription: Fixed receptacle with 1 nut (without 2nd front nut), Key(B) for Printed Circuit; Supplier 1: Mouser; Supplier Part Number 1: 736-PKBM07SLVZ; Supplier 2: Digi-Key; Supplier Part Number 2: PKB.M0.7SL.VZ-ND; ComponentLink1Description: Manufacturer URL; ComponentLink1URL: http://www.lemo.com; ComponentLink2Description: Datasheet; ComponentLink2URL: http://intra.lemo.ch/catalog/ROW/UK_English/P_series_catalog.pdf
footprint PKB.M0.7SL.VZ (Socket, Female, Height 33.5 mm, Through hole)
pins: 1, 2, 3, 4, 5, 6, 7

## PKB.M0.8GL.NA
designator J?
Fixed receptacle with two nuts (back panel mounting), straight print contacts, Key (B), P series, Multipole Type with 8 Contacts; Manufacturer: LEMO; PartNumber: PKB.M0.8GL.NA; Number of contacts: 8; Contact Diameter: 0.7 mm; Test voltage (kV rms) Contact-Contact: 1.05; Rated Current(A): 5; DatasheetVersion: Jun-14; PackageReference: PKB.M0.8GL.NA; PackageDescription: Fixed receptacle with two nuts (back panel mounting), straight print contacts, Key(B) for Printed Circuit; ComponentLink1Description: Manufacturer URL; ComponentLink1URL: http://www.lemo.com; ComponentLink2Description: Datasheet; ComponentLink2URL: http://intra.lemo.ch/catalog/ROW/UK_English/P_series_catalog.pdf
footprint PKB.M0.8GL.NA (Socket, Female, Height 33.5 mm, Through hole)
pins: 1, 2, 3, 4, 5, 6, 7, 8

## PKB.M0.8GL.NG
designator J?
Fixed receptacle with two nuts (back panel mounting), straight print contacts, Key (B),  series, Multipole Type with 8 Contacts; Manufacturer: LEMO; PartNumber: PKB.M0.8GL.NG; Number of contacts: 8; Contact Diameter: 0.7 mm; Test voltage (kV rms) Contact-Contact: 1.05; Rated Current(A): 5; DatasheetVersion: Jun-14; PackageReference: PKB.M0.8GL.NG; PackageDescription: Fixed receptacle with two nuts (back panel mounting), straight print contacts, Key(B) for Printed Circuit; ComponentLink1Description: Manufacturer URL; ComponentLink1URL: http://www.lemo.com; ComponentLink2Description: Datasheet; ComponentLink2URL: http://intra.lemo.ch/catalog/ROW/UK_English/P_series_catalog.pdf
footprint PKB.M0.8GL.NG (Socket, Female, Height 33.5 mm, Through hole)
pins: 1, 2, 3, 4, 5, 6, 7, 8
